# Altium schematic symbol library con-amp.SCHLIB: 238 symbols (part 1 of 3) (continued)
## 557572-1
designator J?, comment AMP connector
footprint 557572-1
part A pins: 1-1 1, 1-2 2, 1-3 3, 1-4 4, 1-5 5, 1-6 6, 1-7 7, 1-8 8, G1 9, G2 10, G3 11
part B pins: 2-1 1, 2-2 2, 2-3 3, 2-4 4, 2-5 5, 2-6 6, 2-7 7, 2-8 8
part C pins: 3-1 1, 3-2 2, 3-3 3, 3-4 4, 3-5 5, 3-6 6, 3-7 7, 3-8 8
part D pins: 4-1 1, 4-2 2, 4-3 3, 4-4 4, 4-5 5, 4-6 6, 4-7 7, 4-8 8
part E pins: 5-1 1, 5-2 2, 5-3 3, 5-4 4, 5-5 5, 5-6 6, 5-7 7, 5-8 8
part F pins: 6-1 1, 6-2 2, 6-3 3, 6-4 4, 6-5 5, 6-6 6, 6-7 7, 6-8 8

## 557573-1
designator J?, comment AMP connector
footprint 557573-1
part A pins: 1-1 1, 1-2 2, 1-3 3, 1-4 4, 1-5 5, 1-6 6, 1-7 7, 1-8 8, G1 9, G2 10, G3 11
part B pins: 2-1 1, 2-2 2, 2-3 3, 2-4 4, 2-5 5, 2-6 6, 2-7 7, 2-8 8
part C pins: 3-1 1, 3-2 2, 3-3 3, 3-4 4, 3-5 5, 3-6 6, 3-7 7, 3-8 8
part D pins: 4-1 1, 4-2 2, 4-3 3, 4-4 4, 4-5 5, 4-6 6, 4-7 7, 4-8 8
part E pins: 5-1 1, 5-2 2, 5-3 3, 5-4 4, 5-5 5, 5-6 6, 5-7 7, 5-8 8
part F pins: 6-1 1, 6-2 2, 6-3 3, 6-4 4, 6-5 5, 6-6 6, 6-7 7, 6-8 8
part G pins: 7-1 1, 7-2 2, 7-3 3, 7-4 4, 7-5 5, 7-6 6, 7-7 7, 7-8 8
part H pins: 8-1 1, 8-2 2, 8-3 3, 8-4 4, 8-5 5, 8-6 6, 8-7 7, 8-8 8

## 557730-1
designator J?, comment AMP connector
footprint 557730-1
pins: 1, 2, 3, 4, 5, 6, 7, 8, G1 S2, G2 S1

## 557785-1
designator J?, comment AMP connector
footprint 557785-1
pins: 1, 2, 3, 4, 5, 6, 7, 8

## 557786-1
designator J?, comment AMP connector
footprint 557786-1
pins: 1-1 1, 1-2 2, 1-3 3, 1-4 4, 1-5 5, 1-6 6, 1-7 7, 1-8 8, G1 S2, G2 S1

## 557969-1
designator J?, comment AMP connector
footprint 557969-1
pins: 1, 2, 3, 4, 5, 6, 7, 8, G1 S2, G2 S1

## 558310-1
designator J?, comment AMP connector
footprint 558310-1
pins: 1, 2, 3, 4, 5, 6, 7, 8, G1 S2, G2 S1

## 558872-1
designator J?, comment AMP connector
footprint 558872-1
pins: 1, 2, 3, 4

## 0569564-3
designator J?, comment MODULAR JACK 8 POS., RIGHT ANGLE, LOW PROFILE WITH LEDS   Source: http://ecommas.tycoelectronics.com/.. 569564_K.pdf
footprint 0569564
part A pins: 1, 2, 3, 4, 5, 6, 7, 8, S1, S2
part B pins: A1 A, C1 C
part C pins: A2 A, C2 C

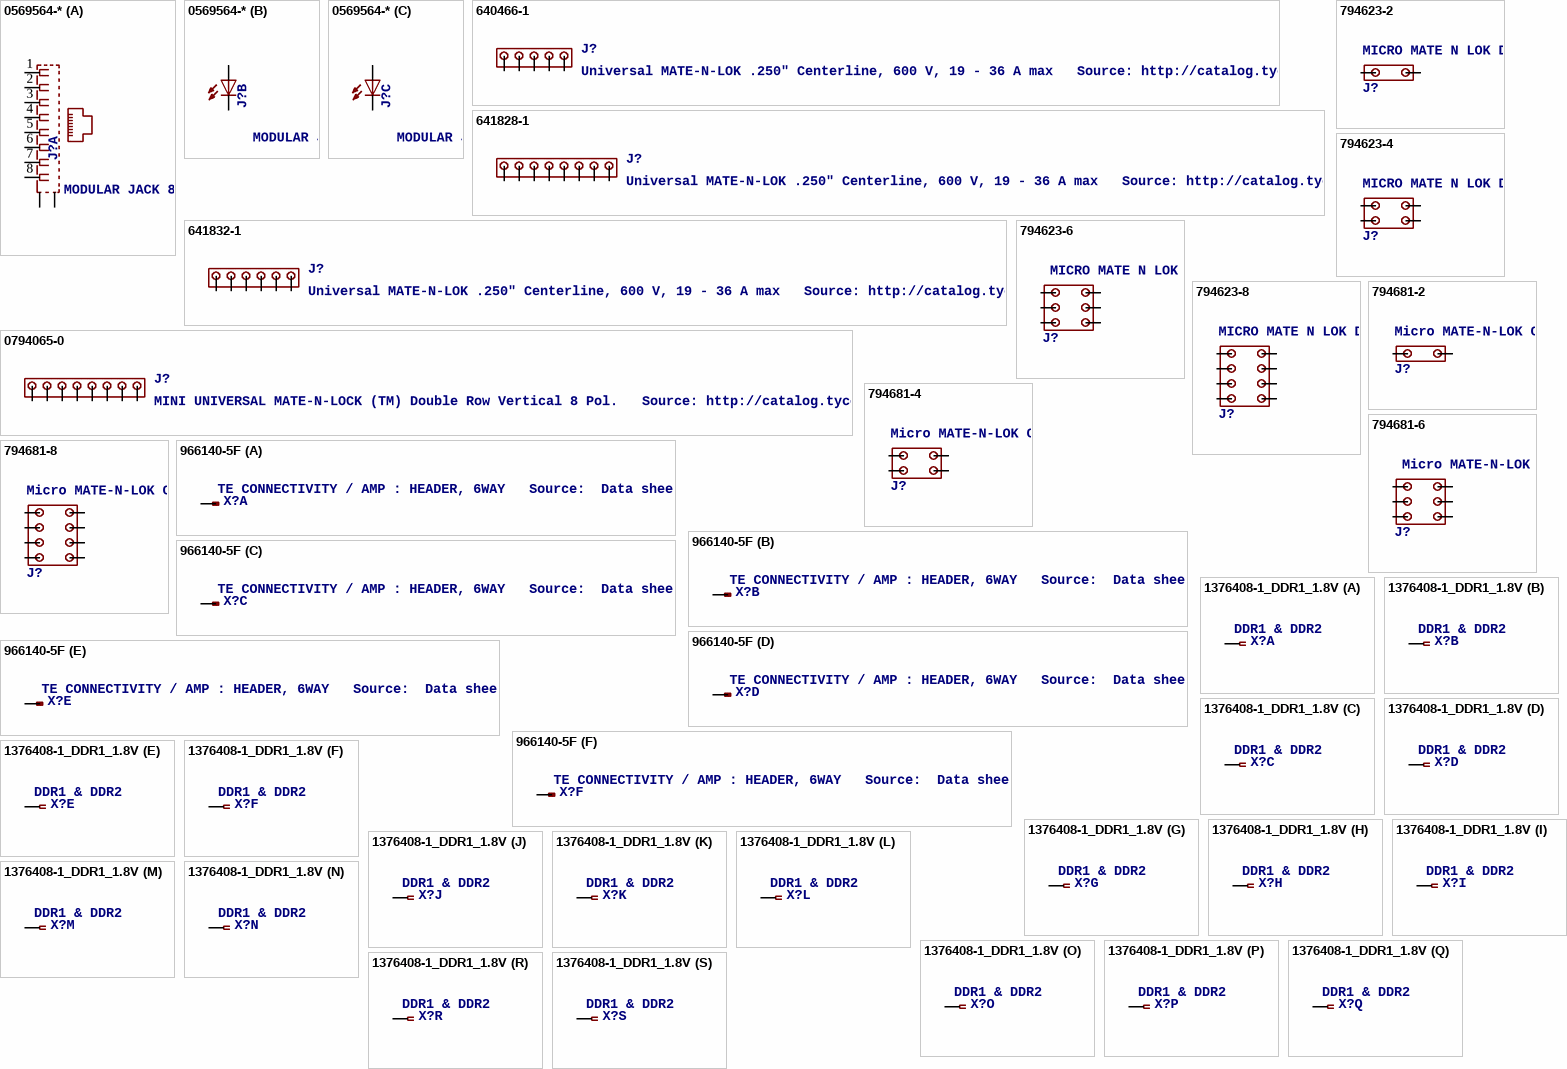
[diagram p5: symbols 0569564-* to 1376408-1_DDR1_1.8V]

## 0569564-*
designator J?, comment MODULAR JACK 8 POS., RIGHT ANGLE, LOW PROFILE WITH LEDS   Source: http://ecommas.tycoelectronics.com/.. 569564_K.pdf
footprint 0569564
part A pins: 1, 2, 3, 4, 5, 6, 7, 8, S1, S2
part B pins: A1 A, C1 C
part C pins: A2 A, C2 C

## 640466-1
designator J?, comment Universal MATE-N-LOK .250" Centerline, 600 V, 19 - 36 A max   Source: http://catalog.tycoelectronics.com/ .. ENG_CD_640466_M.pdf
footprint 640466-1
pins: 1, 2, 3, 4, 5

## 641828-1
designator J?, comment Universal MATE-N-LOK .250" Centerline, 600 V, 19 - 36 A max   Source: http://catalog.tycoelectronics.com/ .. ENG_CD_641828_M.pdf
footprint 641828-1
pins: 1, 2, 3, 4, 5, 6, 7, 8

## 641832-1
designator J?, comment Universal MATE-N-LOK .250" Centerline, 600 V, 19 - 36 A max   Source: http://catalog.tycoelectronics.com/ .. ENG_CD_641832_L.pdf
footprint 641832-1
pins: 1, 2, 3, 4, 5, 6

## 0794065-0
designator J?, comment MINI UNIVERSAL MATE-N-LOCK (TM) Double Row Vertical 8 Pol.   Source: http://catalog.tycoelectronics.com .. ENG_CD_794065_D1.pdf
footprint 0794065-0
pins: 1, 2, 3, 4, 5, 6, 7, 8

## 794623-2
designator J?, comment MICRO MATE N LOK Dual Row, grid 1.5 mm   Source: http://catalog.tycoelectronics.com .. ENG_CD_794623_F.pdf
footprint 794623-2
pins: 1, 2

## 794623-4
designator J?, comment MICRO MATE N LOK Dual Row, grid 1.5 mm   Source: http://catalog.tycoelectronics.com .. ENG_CD_794623_F.pdf
footprint 794623-4
pins: 1, 2, 3, 4

## 794623-6
designator J?, comment MICRO MATE N LOK Dual Row, grid 1.5 mm   Source: http://catalog.tycoelectronics.com .. ENG_CD_794623_F.pdf
footprint 794623-6
pins: 1, 2, 3, 4, 5, 6

## 794623-8
designator J?, comment MICRO MATE N LOK Dual Row, grid 1.5 mm   Source: http://catalog.tycoelectronics.com .. ENG_CD_794623_F.pdf
footprint 794623-8
pins: 1, 2, 3, 4, 5, 6, 7, 8

## 794681-2
designator J?, comment Micro MATE-N-LOK Connectors grid 1.5mm   Dual Row Through Hole Vertical Metal Through Hole Holddowns Source: ENG_CD_794681_E.pdf
footprint 794681-2
pins: 1, 2

## 794681-4
designator J?, comment Micro MATE-N-LOK Connectors grid 1.5mm   Dual Row Through Hole Vertical Metal Through Hole Holddowns Source: ENG_CD_794681_E.pdf
footprint 794681-4
pins: 1, 2, 3, 4

## 794681-6
designator J?, comment Micro MATE-N-LOK Connectors grid 1.5mm   Dual Row Through Hole Vertical Metal Through Hole Holddowns Source: ENG_CD_794681_E.pdf
footprint 794681-6
pins: 1, 2, 3, 4, 5, 6

## 794681-8
designator J?, comment Micro MATE-N-LOK Connectors grid 1.5mm   Dual Row Through Hole Vertical Metal Through Hole Holddowns Source: ENG_CD_794681_E.pdf
footprint 794681-8
pins: 1, 2, 3, 4, 5, 6, 7, 8

## 966140-5F
designator X?, comment TE CONNECTIVITY / AMP : HEADER, 6WAY   Source:  Data sheet
footprint 966140-5F
part A pins: 1
part B pins: 2 1
part C pins: 3 1
part D pins: 4 1
part E pins: 5 1
part F pins: 6 1

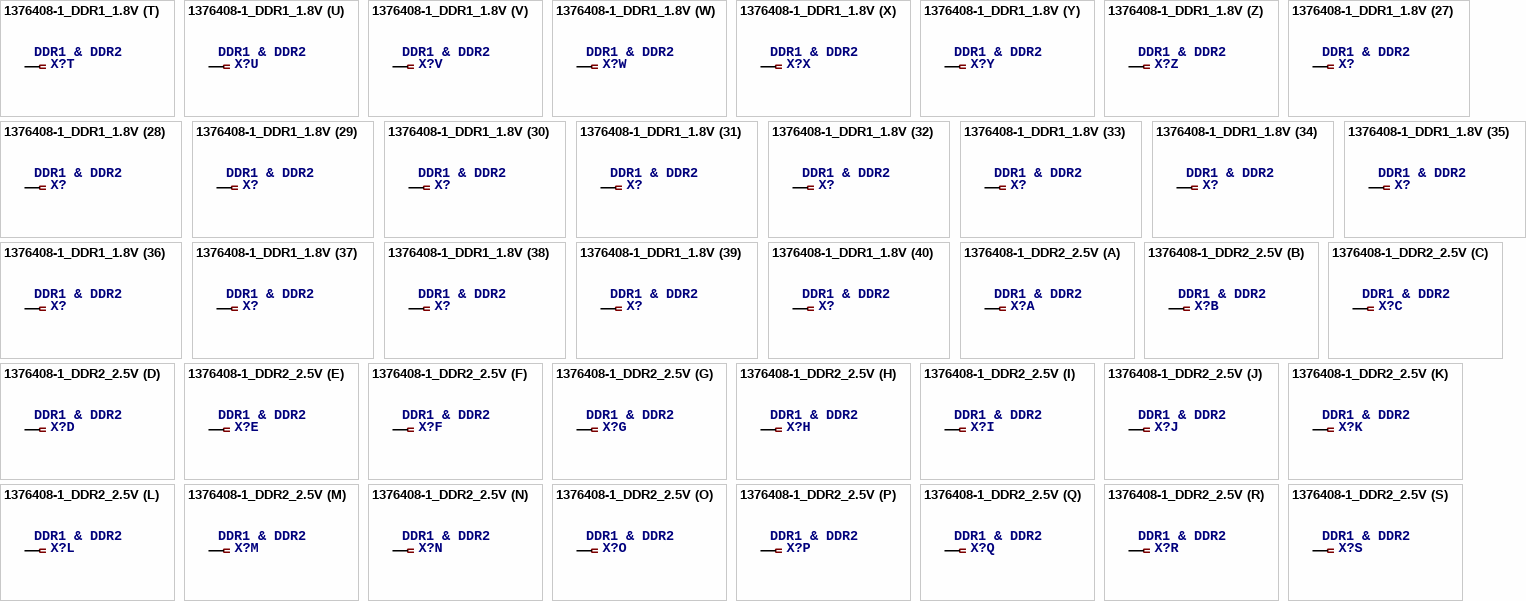
[diagram p6: symbols 1376408-1_DDR1_1.8V to 1376408-1_DDR2_2.5V]

## 1376408-1_DDR1_1.8V
designator X?, comment DDR1 & DDR2 SODIMM SOCKET 0.6mm Pitch 200 Pos.   Standard Profile, Standard Type (used on Kontron X-Board) Source: http://catalog.tycoelectronics.com .. JPN_CD_1376408_S.pdf
footprint 1-1376408-1
part A pins: 1
part B pins: 2 1
part C pins: 3 1
part D pins: 4 1
part E pins: 5 1
part F pins: 6 1
part G pins: 7 1
part H pins: 8 1
part I pins: 9 1
part J pins: 10 1
part K pins: 11 1
part L pins: 12 1
part M pins: 13 1
part N pins: 14 1
part O pins: 15 1
part P pins: 16 1
part Q pins: 17 1
part R pins: 18 1
part S pins: 19 1
part T pins: 20 1
part U pins: 21 1
part V pins: 22 1
part W pins: 23 1
part X pins: 24 1
part Y pins: 25 1
part Z pins: 26 1
part 27 pins: 27 1
part 28 pins: 28 1
part 29 pins: 29 1
part 30 pins: 30 1
part 31 pins: 31 1
part 32 pins: 32 1
part 33 pins: 33 1
part 34 pins: 34 1
part 35 pins: 35 1
part 36 pins: 36 1
part 37 pins: 37 1
part 38 pins: 38 1
part 39 pins: 39 1
part 40 pins: 40 1
part 41 pins: 41 1
part 42 pins: 42 1
part 43 pins: 43 1
part 44 pins: 44 1
part 45 pins: 45 1
part 46 pins: 46 1
part 47 pins: 47 1
part 48 pins: 48 1
part 49 pins: 49 1
part 50 pins: 50 1
part 51 pins: 51 1
part 52 pins: 52 1
part 53 pins: 53 1
part 54 pins: 54 1
part 55 pins: 55 1
part 56 pins: 56 1
part 57 pins: 57 1
part 58 pins: 58 1
part 59 pins: 59 1
part 60 pins: 60 1
part 61 pins: 61 1
part 62 pins: 62 1
part 63 pins: 63 1
part 64 pins: 64 1
part 65 pins: 65 1
part 66 pins: 66 1
part 67 pins: 67 1
part 68 pins: 68 1
part 69 pins: 69 1
part 70 pins: 70 1
part 71 pins: 71 1
part 72 pins: 72 1
part 73 pins: 73 1
part 74 pins: 74 1
part 75 pins: 75 1
part 76 pins: 76 1
part 77 pins: 77 1
part 78 pins: 78 1
part 79 pins: 79 1
part 80 pins: 80 1
part 81 pins: 81 1
part 82 pins: 82 1
part 83 pins: 83 1
part 84 pins: 84 1
part 85 pins: 85 1
part 86 pins: 86 1
part 87 pins: 87 1
part 88 pins: 88 1
part 89 pins: 89 1
part 90 pins: 90 1
part 91 pins: 91 1
part 92 pins: 92 1
part 93 pins: 93 1
part 94 pins: 94 1
part 95 pins: 95 1
part 96 pins: 96 1
part 97 pins: 97 1
part 98 pins: 98 1
part 99 pins: 99 1
part 100 pins: 100 1
part 101 pins: 101 1
part 102 pins: 102 1
part 103 pins: 103 1
part 104 pins: 104 1
part 105 pins: 105 1
part 106 pins: 106 1
part 107 pins: 107 1
part 108 pins: 108 1
part 109 pins: 109 1
part 110 pins: 110 1
part 111 pins: 111 1
part 112 pins: 112 1
part 113 pins: 113 1
part 114 pins: 114 1
part 115 pins: 115 1
part 116 pins: 116 1
part 117 pins: 117 1
part 118 pins: 118 1
part 119 pins: 119 1
part 120 pins: 120 1
part 121 pins: 121 1
part 122 pins: 122 1
part 123 pins: 123 1
part 124 pins: 124 1
part 125 pins: 125 1
part 126 pins: 126 1
part 127 pins: 127 1
part 128 pins: 128 1
part 129 pins: 129 1
part 130 pins: 130 1
part 131 pins: 131 1
part 132 pins: 132 1
part 133 pins: 133 1
part 134 pins: 134 1
part 135 pins: 135 1
part 136 pins: 136 1
part 137 pins: 137 1
part 138 pins: 138 1
part 139 pins: 139 1
part 140 pins: 140 1
part 141 pins: 141 1
part 142 pins: 142 1
part 143 pins: 143 1
part 144 pins: 144 1
part 145 pins: 145 1
part 146 pins: 146 1
part 147 pins: 147 1
part 148 pins: 148 1
part 149 pins: 149 1
part 150 pins: 150 1
part 151 pins: 151 1
part 152 pins: 152 1
part 153 pins: 153 1
part 154 pins: 154 1
part 155 pins: 155 1
part 156 pins: 156 1
part 157 pins: 157 1
part 158 pins: 158 1
part 159 pins: 159 1
part 160 pins: 160 1
part 161 pins: 161 1
part 162 pins: 162 1
part 163 pins: 163 1
part 164 pins: 164 1
part 165 pins: 165 1
part 166 pins: 166 1
part 167 pins: 167 1
part 168 pins: 168 1
part 169 pins: 169 1
part 170 pins: 170 1
part 171 pins: 171 1
part 172 pins: 172 1
part 173 pins: 173 1
part 174 pins: 174 1
part 175 pins: 175 1
part 176 pins: 176 1
part 177 pins: 177 1
part 178 pins: 178 1
part 179 pins: 179 1
part 180 pins: 180 1
part 181 pins: 181 1
part 182 pins: 182 1
part 183 pins: 183 1
part 184 pins: 184 1
part 185 pins: 185 1
part 186 pins: 186 1
part 187 pins: 187 1
part 188 pins: 188 1
part 189 pins: 189 1
part 190 pins: 190 1
part 191 pins: 191 1
part 192 pins: 192 1
part 193 pins: 193 1
part 194 pins: 194 1
part 195 pins: 195 1
part 196 pins: 196 1
part 197 pins: 197 1
part 198 pins: 198 1
part 199 pins: 199 1
part 200 pins: 200 1

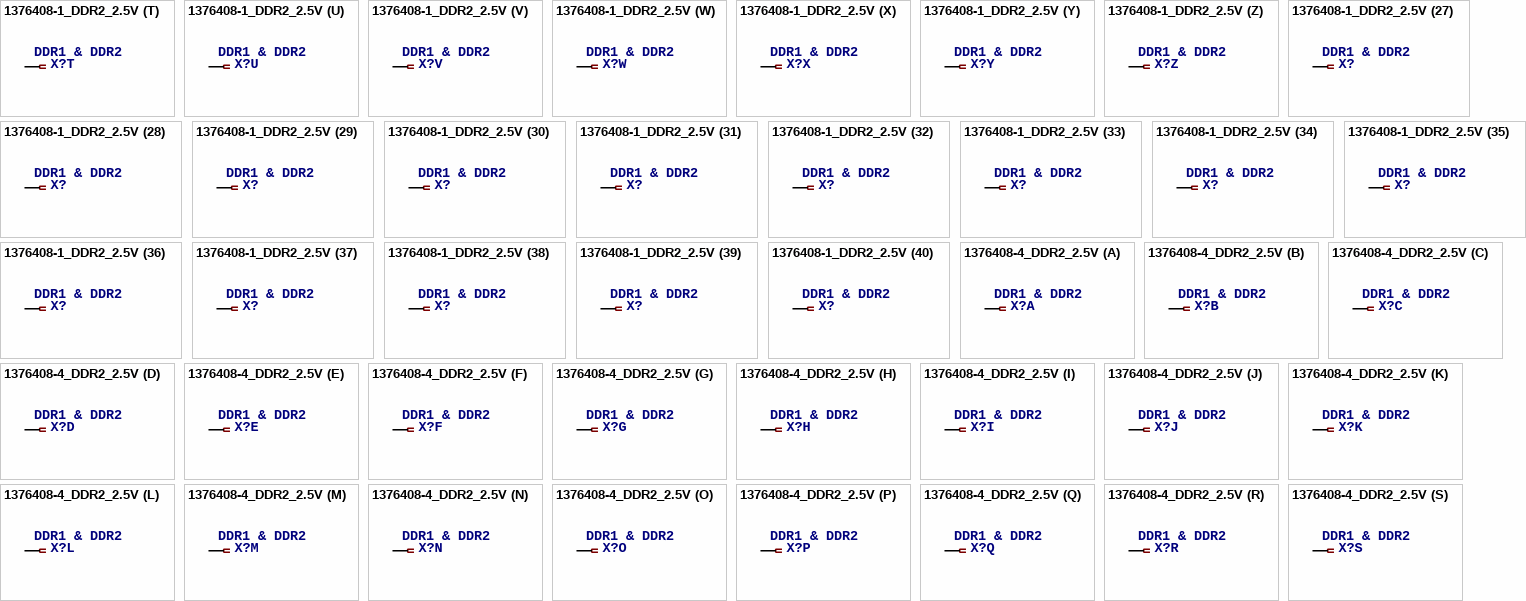
[diagram p7: symbols 1376408-1_DDR2_2.5V to 1376408-4_DDR2_2.5V]

## 1376408-1_DDR2_2.5V
designator X?, comment DDR1 & DDR2 SODIMM SOCKET 0.6mm Pitch 200 Pos.   Standard Profile, Standard Type (used on Kontron X-Board) Source: http://catalog.tycoelectronics.com .. JPN_CD_1376408_S.pdf
footprint 6-1376408-1
part A pins: 1
part B pins: 2 1
part C pins: 3 1
part D pins: 4 1
part E pins: 5 1
part F pins: 6 1
part G pins: 7 1
part H pins: 8 1
part I pins: 9 1
part J pins: 10 1
part K pins: 11 1
part L pins: 12 1
part M pins: 13 1
part N pins: 14 1
part O pins: 15 1
part P pins: 16 1
part Q pins: 17 1
part R pins: 18 1
part S pins: 19 1
part T pins: 20 1
part U pins: 21 1
part V pins: 22 1
part W pins: 23 1
part X pins: 24 1
part Y pins: 25 1
part Z pins: 26 1
part 27 pins: 27 1
part 28 pins: 28 1
part 29 pins: 29 1
part 30 pins: 30 1
part 31 pins: 31 1
part 32 pins: 32 1
part 33 pins: 33 1
part 34 pins: 34 1
part 35 pins: 35 1
part 36 pins: 36 1
part 37 pins: 37 1
part 38 pins: 38 1
part 39 pins: 39 1
part 40 pins: 40 1
part 41 pins: 41 1
part 42 pins: 42 1
part 43 pins: 43 1
part 44 pins: 44 1
part 45 pins: 45 1
part 46 pins: 46 1
part 47 pins: 47 1
part 48 pins: 48 1
part 49 pins: 49 1
part 50 pins: 50 1
part 51 pins: 51 1
part 52 pins: 52 1
part 53 pins: 53 1
part 54 pins: 54 1
part 55 pins: 55 1
part 56 pins: 56 1
part 57 pins: 57 1
part 58 pins: 58 1
part 59 pins: 59 1
part 60 pins: 60 1
part 61 pins: 61 1
part 62 pins: 62 1
part 63 pins: 63 1
part 64 pins: 64 1
part 65 pins: 65 1
part 66 pins: 66 1
part 67 pins: 67 1
part 68 pins: 68 1
part 69 pins: 69 1
part 70 pins: 70 1
part 71 pins: 71 1
part 72 pins: 72 1
part 73 pins: 73 1
part 74 pins: 74 1
part 75 pins: 75 1
part 76 pins: 76 1
part 77 pins: 77 1
part 78 pins: 78 1
part 79 pins: 79 1
part 80 pins: 80 1
part 81 pins: 81 1
part 82 pins: 82 1
part 83 pins: 83 1
part 84 pins: 84 1
part 85 pins: 85 1
part 86 pins: 86 1
part 87 pins: 87 1
part 88 pins: 88 1
part 89 pins: 89 1
part 90 pins: 90 1
part 91 pins: 91 1
part 92 pins: 92 1
part 93 pins: 93 1
part 94 pins: 94 1
part 95 pins: 95 1
part 96 pins: 96 1
part 97 pins: 97 1
part 98 pins: 98 1
part 99 pins: 99 1
part 100 pins: 100 1
part 101 pins: 101 1
part 102 pins: 102 1
part 103 pins: 103 1
part 104 pins: 104 1
part 105 pins: 105 1
part 106 pins: 106 1
part 107 pins: 107 1
part 108 pins: 108 1
part 109 pins: 109 1
part 110 pins: 110 1
part 111 pins: 111 1
part 112 pins: 112 1
part 113 pins: 113 1
part 114 pins: 114 1
part 115 pins: 115 1
part 116 pins: 116 1
part 117 pins: 117 1
part 118 pins: 118 1
part 119 pins: 119 1
part 120 pins: 120 1
part 121 pins: 121 1
part 122 pins: 122 1
part 123 pins: 123 1
part 124 pins: 124 1
part 125 pins: 125 1
part 126 pins: 126 1
part 127 pins: 127 1
part 128 pins: 128 1
part 129 pins: 129 1
part 130 pins: 130 1
part 131 pins: 131 1
part 132 pins: 132 1
part 133 pins: 133 1
part 134 pins: 134 1
part 135 pins: 135 1
part 136 pins: 136 1
part 137 pins: 137 1
part 138 pins: 138 1
part 139 pins: 139 1
part 140 pins: 140 1
part 141 pins: 141 1
part 142 pins: 142 1
part 143 pins: 143 1
part 144 pins: 144 1
part 145 pins: 145 1
part 146 pins: 146 1
part 147 pins: 147 1
part 148 pins: 148 1
part 149 pins: 149 1
part 150 pins: 150 1
part 151 pins: 151 1
part 152 pins: 152 1
part 153 pins: 153 1
part 154 pins: 154 1
part 155 pins: 155 1
part 156 pins: 156 1
part 157 pins: 157 1
part 158 pins: 158 1
part 159 pins: 159 1
part 160 pins: 160 1
part 161 pins: 161 1
part 162 pins: 162 1
part 163 pins: 163 1
part 164 pins: 164 1
part 165 pins: 165 1
part 166 pins: 166 1
part 167 pins: 167 1
part 168 pins: 168 1
part 169 pins: 169 1
part 170 pins: 170 1
part 171 pins: 171 1
part 172 pins: 172 1
part 173 pins: 173 1
part 174 pins: 174 1
part 175 pins: 175 1
part 176 pins: 176 1
part 177 pins: 177 1
part 178 pins: 178 1
part 179 pins: 179 1
part 180 pins: 180 1
part 181 pins: 181 1
part 182 pins: 182 1
part 183 pins: 183 1
part 184 pins: 184 1
part 185 pins: 185 1
part 186 pins: 186 1
part 187 pins: 187 1
part 188 pins: 188 1
part 189 pins: 189 1
part 190 pins: 190 1
part 191 pins: 191 1
part 192 pins: 192 1
part 193 pins: 193 1
part 194 pins: 194 1
part 195 pins: 195 1
part 196 pins: 196 1
part 197 pins: 197 1
part 198 pins: 198 1
part 199 pins: 199 1
part 200 pins: 200 1

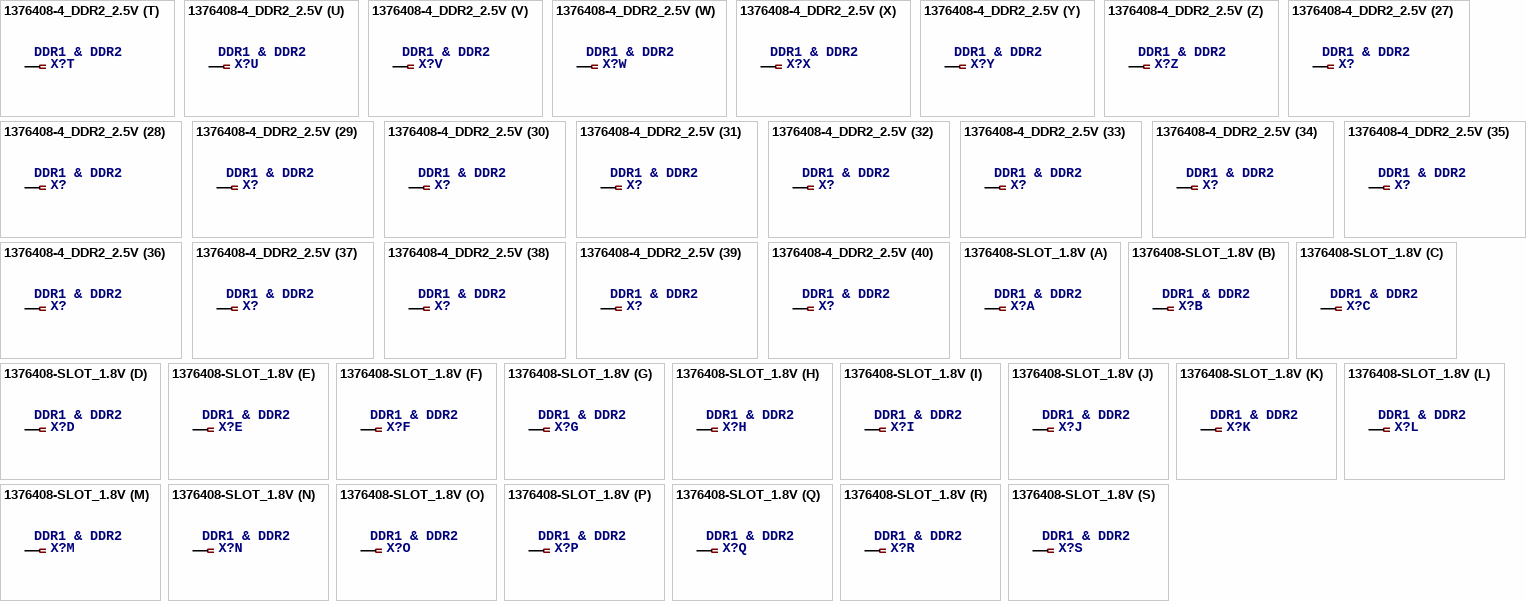
[diagram p8: symbols 1376408-4_DDR2_2.5V to 1376408-SLOT_1.8V]

## 1376408-4_DDR2_2.5V
designator X?, comment DDR1 & DDR2 SODIMM SOCKET 0.6mm Pitch 200 Pos.   Standard Profile, Standard Type (used on Kontron X-Board) Source: http://catalog.tycoelectronics.com .. JPN_CD_1376408_S.pdf
footprint 1-1376408-4
part A pins: 1
part B pins: 2 1
part C pins: 3 1
part D pins: 4 1
part E pins: 5 1
part F pins: 6 1
part G pins: 7 1
part H pins: 8 1
part I pins: 9 1
part J pins: 10 1
part K pins: 11 1
part L pins: 12 1
part M pins: 13 1
part N pins: 14 1
part O pins: 15 1
part P pins: 16 1
part Q pins: 17 1
part R pins: 18 1
part S pins: 19 1
part T pins: 20 1
part U pins: 21 1
part V pins: 22 1
part W pins: 23 1
part X pins: 24 1
part Y pins: 25 1
part Z pins: 26 1
part 27 pins: 27 1
part 28 pins: 28 1
part 29 pins: 29 1
part 30 pins: 30 1
part 31 pins: 31 1
part 32 pins: 32 1
part 33 pins: 33 1
part 34 pins: 34 1
part 35 pins: 35 1
part 36 pins: 36 1
part 37 pins: 37 1
part 38 pins: 38 1
part 39 pins: 39 1
part 40 pins: 40 1
part 41 pins: 41 1
part 42 pins: 42 1
part 43 pins: 43 1
part 44 pins: 44 1
part 45 pins: 45 1
part 46 pins: 46 1
part 47 pins: 47 1
part 48 pins: 48 1
part 49 pins: 49 1
part 50 pins: 50 1
part 51 pins: 51 1
part 52 pins: 52 1
part 53 pins: 53 1
part 54 pins: 54 1
part 55 pins: 55 1
part 56 pins: 56 1
part 57 pins: 57 1
part 58 pins: 58 1
part 59 pins: 59 1
part 60 pins: 60 1
part 61 pins: 61 1
part 62 pins: 62 1
part 63 pins: 63 1
part 64 pins: 64 1
part 65 pins: 65 1
part 66 pins: 66 1
part 67 pins: 67 1
part 68 pins: 68 1
part 69 pins: 69 1
part 70 pins: 70 1
part 71 pins: 71 1
part 72 pins: 72 1
part 73 pins: 73 1
part 74 pins: 74 1
part 75 pins: 75 1
part 76 pins: 76 1
part 77 pins: 77 1
part 78 pins: 78 1
part 79 pins: 79 1
part 80 pins: 80 1
part 81 pins: 81 1
part 82 pins: 82 1
part 83 pins: 83 1
part 84 pins: 84 1
part 85 pins: 85 1
part 86 pins: 86 1
part 87 pins: 87 1
part 88 pins: 88 1
part 89 pins: 89 1
part 90 pins: 90 1
part 91 pins: 91 1
part 92 pins: 92 1
part 93 pins: 93 1
part 94 pins: 94 1
part 95 pins: 95 1
part 96 pins: 96 1
part 97 pins: 97 1
part 98 pins: 98 1
part 99 pins: 99 1
part 100 pins: 100 1
part 101 pins: 101 1
part 102 pins: 102 1
part 103 pins: 103 1
part 104 pins: 104 1
part 105 pins: 105 1
part 106 pins: 106 1
part 107 pins: 107 1
part 108 pins: 108 1
part 109 pins: 109 1
part 110 pins: 110 1
part 111 pins: 111 1
part 112 pins: 112 1
part 113 pins: 113 1
part 114 pins: 114 1
part 115 pins: 115 1
part 116 pins: 116 1
part 117 pins: 117 1
part 118 pins: 118 1
part 119 pins: 119 1
part 120 pins: 120 1
part 121 pins: 121 1
part 122 pins: 122 1
part 123 pins: 123 1
part 124 pins: 124 1
part 125 pins: 125 1
part 126 pins: 126 1
part 127 pins: 127 1
part 128 pins: 128 1
part 129 pins: 129 1
part 130 pins: 130 1
part 131 pins: 131 1
part 132 pins: 132 1
part 133 pins: 133 1
part 134 pins: 134 1
part 135 pins: 135 1
part 136 pins: 136 1
part 137 pins: 137 1
part 138 pins: 138 1
part 139 pins: 139 1
part 140 pins: 140 1
part 141 pins: 141 1
part 142 pins: 142 1
part 143 pins: 143 1
part 144 pins: 144 1
part 145 pins: 145 1
part 146 pins: 146 1
part 147 pins: 147 1
part 148 pins: 148 1
part 149 pins: 149 1
part 150 pins: 150 1
part 151 pins: 151 1
part 152 pins: 152 1
part 153 pins: 153 1
part 154 pins: 154 1
part 155 pins: 155 1
part 156 pins: 156 1
part 157 pins: 157 1
part 158 pins: 158 1
part 159 pins: 159 1
part 160 pins: 160 1
part 161 pins: 161 1
part 162 pins: 162 1
part 163 pins: 163 1
part 164 pins: 164 1
part 165 pins: 165 1
part 166 pins: 166 1
part 167 pins: 167 1
part 168 pins: 168 1
part 169 pins: 169 1
part 170 pins: 170 1
part 171 pins: 171 1
part 172 pins: 172 1
part 173 pins: 173 1
part 174 pins: 174 1
part 175 pins: 175 1
part 176 pins: 176 1
part 177 pins: 177 1
part 178 pins: 178 1
part 179 pins: 179 1
part 180 pins: 180 1
part 181 pins: 181 1
part 182 pins: 182 1
part 183 pins: 183 1
part 184 pins: 184 1
part 185 pins: 185 1
part 186 pins: 186 1
part 187 pins: 187 1
part 188 pins: 188 1
part 189 pins: 189 1
part 190 pins: 190 1
part 191 pins: 191 1
part 192 pins: 192 1
part 193 pins: 193 1
part 194 pins: 194 1
part 195 pins: 195 1
part 196 pins: 196 1
part 197 pins: 197 1
part 198 pins: 198 1
part 199 pins: 199 1
part 200 pins: 200 1

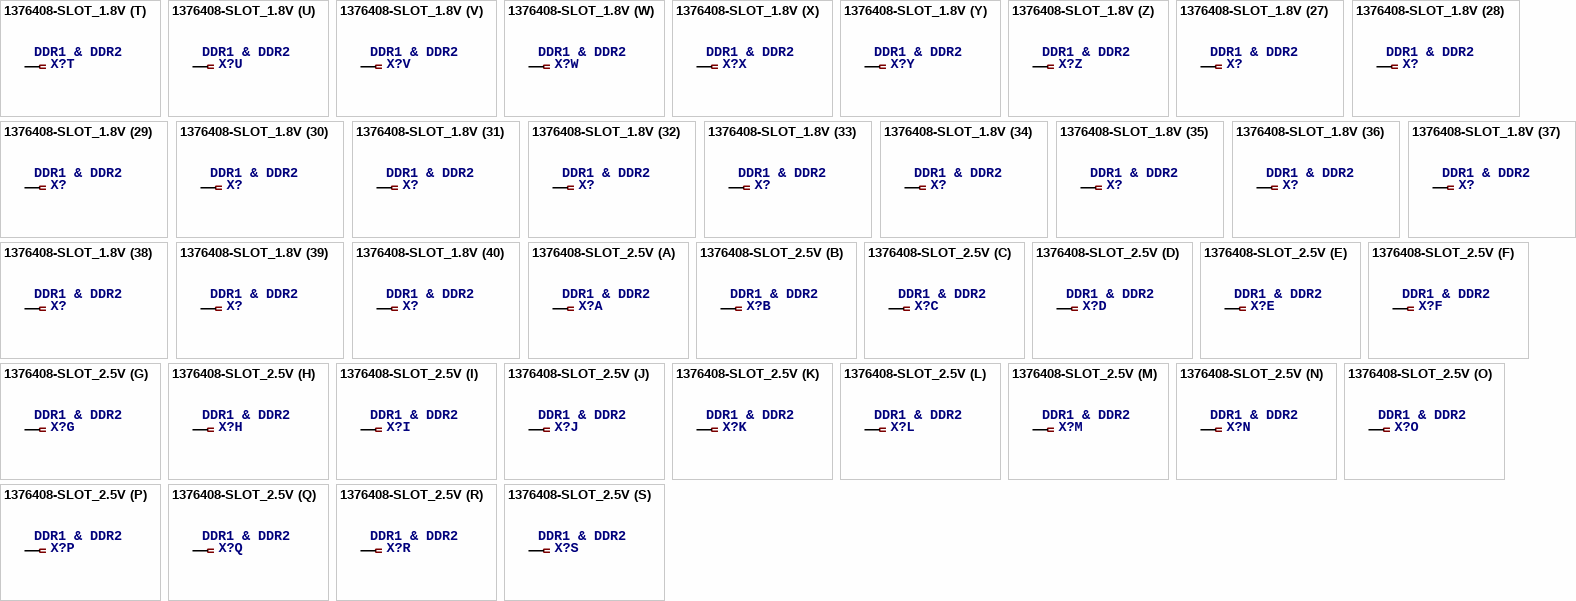
[diagram p9: symbols 1376408-SLOT_1.8V to 1376408-SLOT_2.5V]

## 1376408-SLOT_1.8V
designator X?, comment DDR1 & DDR2 SODIMM SOCKET 0.6mm Pitch 200 Pos.   Standard Profile, Standard Type (used on Kontron X-Board) Source: http://catalog.tycoelectronics.com .. JPN_CD_1376408_S.pdf
footprint SLOT-1376408-1_1.8V
part A pins: 1
part B pins: 2 1
part C pins: 3 1
part D pins: 4 1
part E pins: 5 1
part F pins: 6 1
part G pins: 7 1
part H pins: 8 1
part I pins: 9 1
part J pins: 10 1
part K pins: 11 1
part L pins: 12 1
part M pins: 13 1
part N pins: 14 1
part O pins: 15 1
part P pins: 16 1
part Q pins: 17 1
part R pins: 18 1
part S pins: 19 1
part T pins: 20 1
part U pins: 21 1
part V pins: 22 1
part W pins: 23 1
part X pins: 24 1
part Y pins: 25 1
part Z pins: 26 1
part 27 pins: 27 1
part 28 pins: 28 1
part 29 pins: 29 1
part 30 pins: 30 1
part 31 pins: 31 1
part 32 pins: 32 1
part 33 pins: 33 1
part 34 pins: 34 1
part 35 pins: 35 1
part 36 pins: 36 1
part 37 pins: 37 1
part 38 pins: 38 1
part 39 pins: 39 1
part 40 pins: 40 1
part 41 pins: 41 1
part 42 pins: 42 1
part 43 pins: 43 1
part 44 pins: 44 1
part 45 pins: 45 1
part 46 pins: 46 1
part 47 pins: 47 1
part 48 pins: 48 1
part 49 pins: 49 1
part 50 pins: 50 1
part 51 pins: 51 1
part 52 pins: 52 1
part 53 pins: 53 1
part 54 pins: 54 1
part 55 pins: 55 1
part 56 pins: 56 1
part 57 pins: 57 1
part 58 pins: 58 1
part 59 pins: 59 1
part 60 pins: 60 1
part 61 pins: 61 1
part 62 pins: 62 1
part 63 pins: 63 1
part 64 pins: 64 1
part 65 pins: 65 1
part 66 pins: 66 1
part 67 pins: 67 1
part 68 pins: 68 1
part 69 pins: 69 1
part 70 pins: 70 1
part 71 pins: 71 1
part 72 pins: 72 1
part 73 pins: 73 1
part 74 pins: 74 1
part 75 pins: 75 1
part 76 pins: 76 1
part 77 pins: 77 1
part 78 pins: 78 1
part 79 pins: 79 1
part 80 pins: 80 1
part 81 pins: 81 1
part 82 pins: 82 1
part 83 pins: 83 1
part 84 pins: 84 1
part 85 pins: 85 1
part 86 pins: 86 1
part 87 pins: 87 1
part 88 pins: 88 1
part 89 pins: 89 1
part 90 pins: 90 1
part 91 pins: 91 1
part 92 pins: 92 1
part 93 pins: 93 1
part 94 pins: 94 1
part 95 pins: 95 1
part 96 pins: 96 1
part 97 pins: 97 1
part 98 pins: 98 1
part 99 pins: 99 1
part 100 pins: 100 1
part 101 pins: 101 1
part 102 pins: 102 1
part 103 pins: 103 1
part 104 pins: 104 1
part 105 pins: 105 1
part 106 pins: 106 1
part 107 pins: 107 1
part 108 pins: 108 1
part 109 pins: 109 1
part 110 pins: 110 1
part 111 pins: 111 1
part 112 pins: 112 1
part 113 pins: 113 1
part 114 pins: 114 1
part 115 pins: 115 1
part 116 pins: 116 1
part 117 pins: 117 1
part 118 pins: 118 1
part 119 pins: 119 1
part 120 pins: 120 1
part 121 pins: 121 1
part 122 pins: 122 1
part 123 pins: 123 1
part 124 pins: 124 1
part 125 pins: 125 1
part 126 pins: 126 1
part 127 pins: 127 1
part 128 pins: 128 1
part 129 pins: 129 1
part 130 pins: 130 1
part 131 pins: 131 1
part 132 pins: 132 1
part 133 pins: 133 1
part 134 pins: 134 1
part 135 pins: 135 1
part 136 pins: 136 1
part 137 pins: 137 1
part 138 pins: 138 1
part 139 pins: 139 1
part 140 pins: 140 1
part 141 pins: 141 1
part 142 pins: 142 1
part 143 pins: 143 1
part 144 pins: 144 1
part 145 pins: 145 1
part 146 pins: 146 1
part 147 pins: 147 1
part 148 pins: 148 1
part 149 pins: 149 1
part 150 pins: 150 1
part 151 pins: 151 1
part 152 pins: 152 1
part 153 pins: 153 1
part 154 pins: 154 1
part 155 pins: 155 1
part 156 pins: 156 1
part 157 pins: 157 1
part 158 pins: 158 1
part 159 pins: 159 1
part 160 pins: 160 1
part 161 pins: 161 1
part 162 pins: 162 1
part 163 pins: 163 1
part 164 pins: 164 1
part 165 pins: 165 1
part 166 pins: 166 1
part 167 pins: 167 1
part 168 pins: 168 1
part 169 pins: 169 1
part 170 pins: 170 1
part 171 pins: 171 1
part 172 pins: 172 1
part 173 pins: 173 1
part 174 pins: 174 1
part 175 pins: 175 1
part 176 pins: 176 1
part 177 pins: 177 1
part 178 pins: 178 1
part 179 pins: 179 1
part 180 pins: 180 1
part 181 pins: 181 1
part 182 pins: 182 1
part 183 pins: 183 1
part 184 pins: 184 1
part 185 pins: 185 1
part 186 pins: 186 1
part 187 pins: 187 1
part 188 pins: 188 1
part 189 pins: 189 1
part 190 pins: 190 1
part 191 pins: 191 1
part 192 pins: 192 1
part 193 pins: 193 1
part 194 pins: 194 1
part 195 pins: 195 1
part 196 pins: 196 1
part 197 pins: 197 1
part 198 pins: 198 1
part 199 pins: 199 1
part 200 pins: 200 1

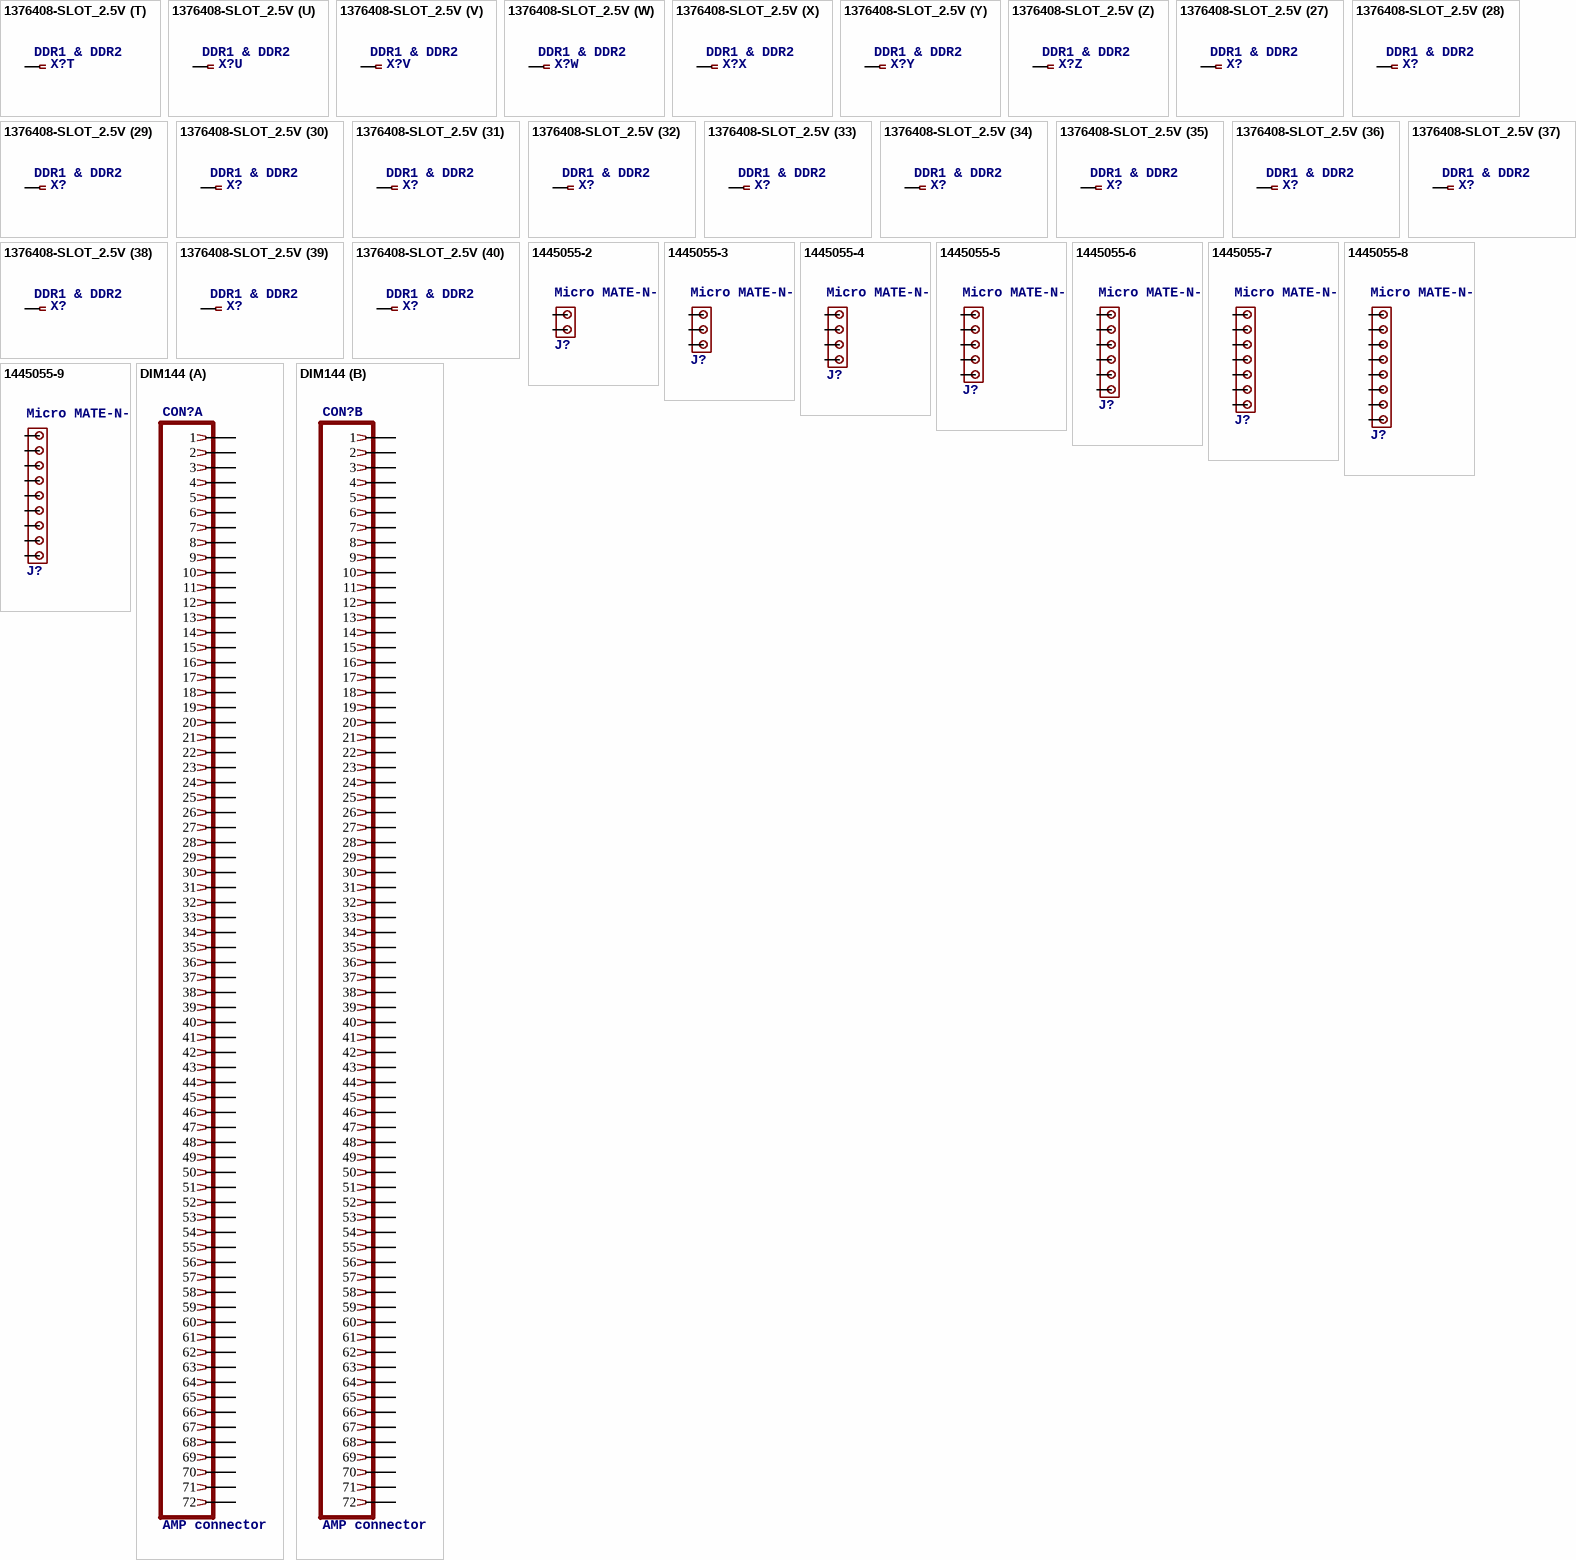
[diagram p10: symbols 1376408-SLOT_2.5V to DIM144]

## 1376408-SLOT_2.5V
designator X?, comment DDR1 & DDR2 SODIMM SOCKET 0.6mm Pitch 200 Pos.   Standard Profile, Standard Type (used on Kontron X-Board) Source: http://catalog.tycoelectronics.com .. JPN_CD_1376408_S.pdf
footprint SLOT-1376408-1_2.5V
part A pins: 1
part B pins: 2 1
part C pins: 3 1
part D pins: 4 1
part E pins: 5 1
part F pins: 6 1
part G pins: 7 1
part H pins: 8 1
part I pins: 9 1
part J pins: 10 1
part K pins: 11 1
part L pins: 12 1
part M pins: 13 1
part N pins: 14 1
part O pins: 15 1
part P pins: 16 1
part Q pins: 17 1
part R pins: 18 1
part S pins: 19 1
part T pins: 20 1
part U pins: 21 1
part V pins: 22 1
part W pins: 23 1
part X pins: 24 1
part Y pins: 25 1
part Z pins: 26 1
part 27 pins: 27 1
part 28 pins: 28 1
part 29 pins: 29 1
part 30 pins: 30 1
part 31 pins: 31 1
part 32 pins: 32 1
part 33 pins: 33 1
part 34 pins: 34 1
part 35 pins: 35 1
part 36 pins: 36 1
part 37 pins: 37 1
part 38 pins: 38 1
part 39 pins: 39 1
part 40 pins: 40 1
part 41 pins: 41 1
part 42 pins: 42 1
part 43 pins: 43 1
part 44 pins: 44 1
part 45 pins: 45 1
part 46 pins: 46 1
part 47 pins: 47 1
part 48 pins: 48 1
part 49 pins: 49 1
part 50 pins: 50 1
part 51 pins: 51 1
part 52 pins: 52 1
part 53 pins: 53 1
part 54 pins: 54 1
part 55 pins: 55 1
part 56 pins: 56 1
part 57 pins: 57 1
part 58 pins: 58 1
part 59 pins: 59 1
part 60 pins: 60 1
part 61 pins: 61 1
part 62 pins: 62 1
part 63 pins: 63 1
part 64 pins: 64 1
part 65 pins: 65 1
part 66 pins: 66 1
part 67 pins: 67 1
part 68 pins: 68 1
part 69 pins: 69 1
part 70 pins: 70 1
part 71 pins: 71 1
part 72 pins: 72 1
part 73 pins: 73 1
part 74 pins: 74 1
part 75 pins: 75 1
part 76 pins: 76 1
part 77 pins: 77 1
part 78 pins: 78 1
part 79 pins: 79 1
part 80 pins: 80 1
part 81 pins: 81 1
part 82 pins: 82 1
part 83 pins: 83 1
part 84 pins: 84 1
part 85 pins: 85 1
part 86 pins: 86 1
part 87 pins: 87 1
part 88 pins: 88 1
part 89 pins: 89 1
part 90 pins: 90 1
part 91 pins: 91 1
part 92 pins: 92 1
part 93 pins: 93 1
part 94 pins: 94 1
part 95 pins: 95 1
part 96 pins: 96 1
part 97 pins: 97 1
part 98 pins: 98 1
part 99 pins: 99 1
part 100 pins: 100 1
part 101 pins: 101 1
part 102 pins: 102 1
part 103 pins: 103 1
part 104 pins: 104 1
part 105 pins: 105 1
part 106 pins: 106 1
part 107 pins: 107 1
part 108 pins: 108 1
part 109 pins: 109 1
part 110 pins: 110 1
part 111 pins: 111 1
part 112 pins: 112 1
part 113 pins: 113 1
part 114 pins: 114 1
part 115 pins: 115 1
part 116 pins: 116 1
part 117 pins: 117 1
part 118 pins: 118 1
part 119 pins: 119 1
part 120 pins: 120 1
part 121 pins: 121 1
part 122 pins: 122 1
part 123 pins: 123 1
part 124 pins: 124 1
part 125 pins: 125 1
part 126 pins: 126 1
part 127 pins: 127 1
part 128 pins: 128 1
part 129 pins: 129 1
part 130 pins: 130 1
part 131 pins: 131 1
part 132 pins: 132 1
part 133 pins: 133 1
part 134 pins: 134 1
part 135 pins: 135 1
part 136 pins: 136 1
part 137 pins: 137 1
part 138 pins: 138 1
part 139 pins: 139 1
part 140 pins: 140 1
part 141 pins: 141 1
part 142 pins: 142 1
part 143 pins: 143 1
part 144 pins: 144 1
part 145 pins: 145 1
part 146 pins: 146 1
part 147 pins: 147 1
part 148 pins: 148 1
part 149 pins: 149 1
part 150 pins: 150 1
part 151 pins: 151 1
part 152 pins: 152 1
part 153 pins: 153 1
part 154 pins: 154 1
part 155 pins: 155 1
part 156 pins: 156 1
part 157 pins: 157 1
part 158 pins: 158 1
part 159 pins: 159 1
part 160 pins: 160 1
part 161 pins: 161 1
part 162 pins: 162 1
part 163 pins: 163 1
part 164 pins: 164 1
part 165 pins: 165 1
part 166 pins: 166 1
part 167 pins: 167 1
part 168 pins: 168 1
part 169 pins: 169 1
part 170 pins: 170 1
part 171 pins: 171 1
part 172 pins: 172 1
part 173 pins: 173 1
part 174 pins: 174 1
part 175 pins: 175 1
part 176 pins: 176 1
part 177 pins: 177 1
part 178 pins: 178 1
part 179 pins: 179 1
part 180 pins: 180 1
part 181 pins: 181 1
part 182 pins: 182 1
part 183 pins: 183 1
part 184 pins: 184 1
part 185 pins: 185 1
part 186 pins: 186 1
part 187 pins: 187 1
part 188 pins: 188 1
part 189 pins: 189 1
part 190 pins: 190 1
part 191 pins: 191 1
part 192 pins: 192 1
part 193 pins: 193 1
part 194 pins: 194 1
part 195 pins: 195 1
part 196 pins: 196 1
part 197 pins: 197 1
part 198 pins: 198 1
part 199 pins: 199 1
part 200 pins: 200 1

## 1445055-2
designator J?, comment Micro MATE-N-LOK Connectors grid 1.5 mm   Source: ENG_CD_1445055_A.pdf
footprint 1445055-2
pins: 1, 2

## 1445055-3
designator J?, comment Micro MATE-N-LOK Connectors grid 1.5 mm   Source: ENG_CD_1445055_A.pdf
footprint 1445055-3
pins: 1, 2, 3

## 1445055-4
designator J?, comment Micro MATE-N-LOK Connectors grid 1.5 mm   Source: ENG_CD_1445055_A.pdf
footprint 1445055-4
pins: 1, 2, 3, 4